# Altium footprint library PcbLib_ICs.PcbLib: 317 footprints (part 8 of 24)
Each footprint in its own frame and in the unit in brackets; x right, y up, seen from the top. Pads: shape width x height; smd on the part's side, far side on the other; paste and mask are expansions set on the pad; w line width, h text height; cw(c..) or ccw(c..) is an arc to the next point about the centre after c.
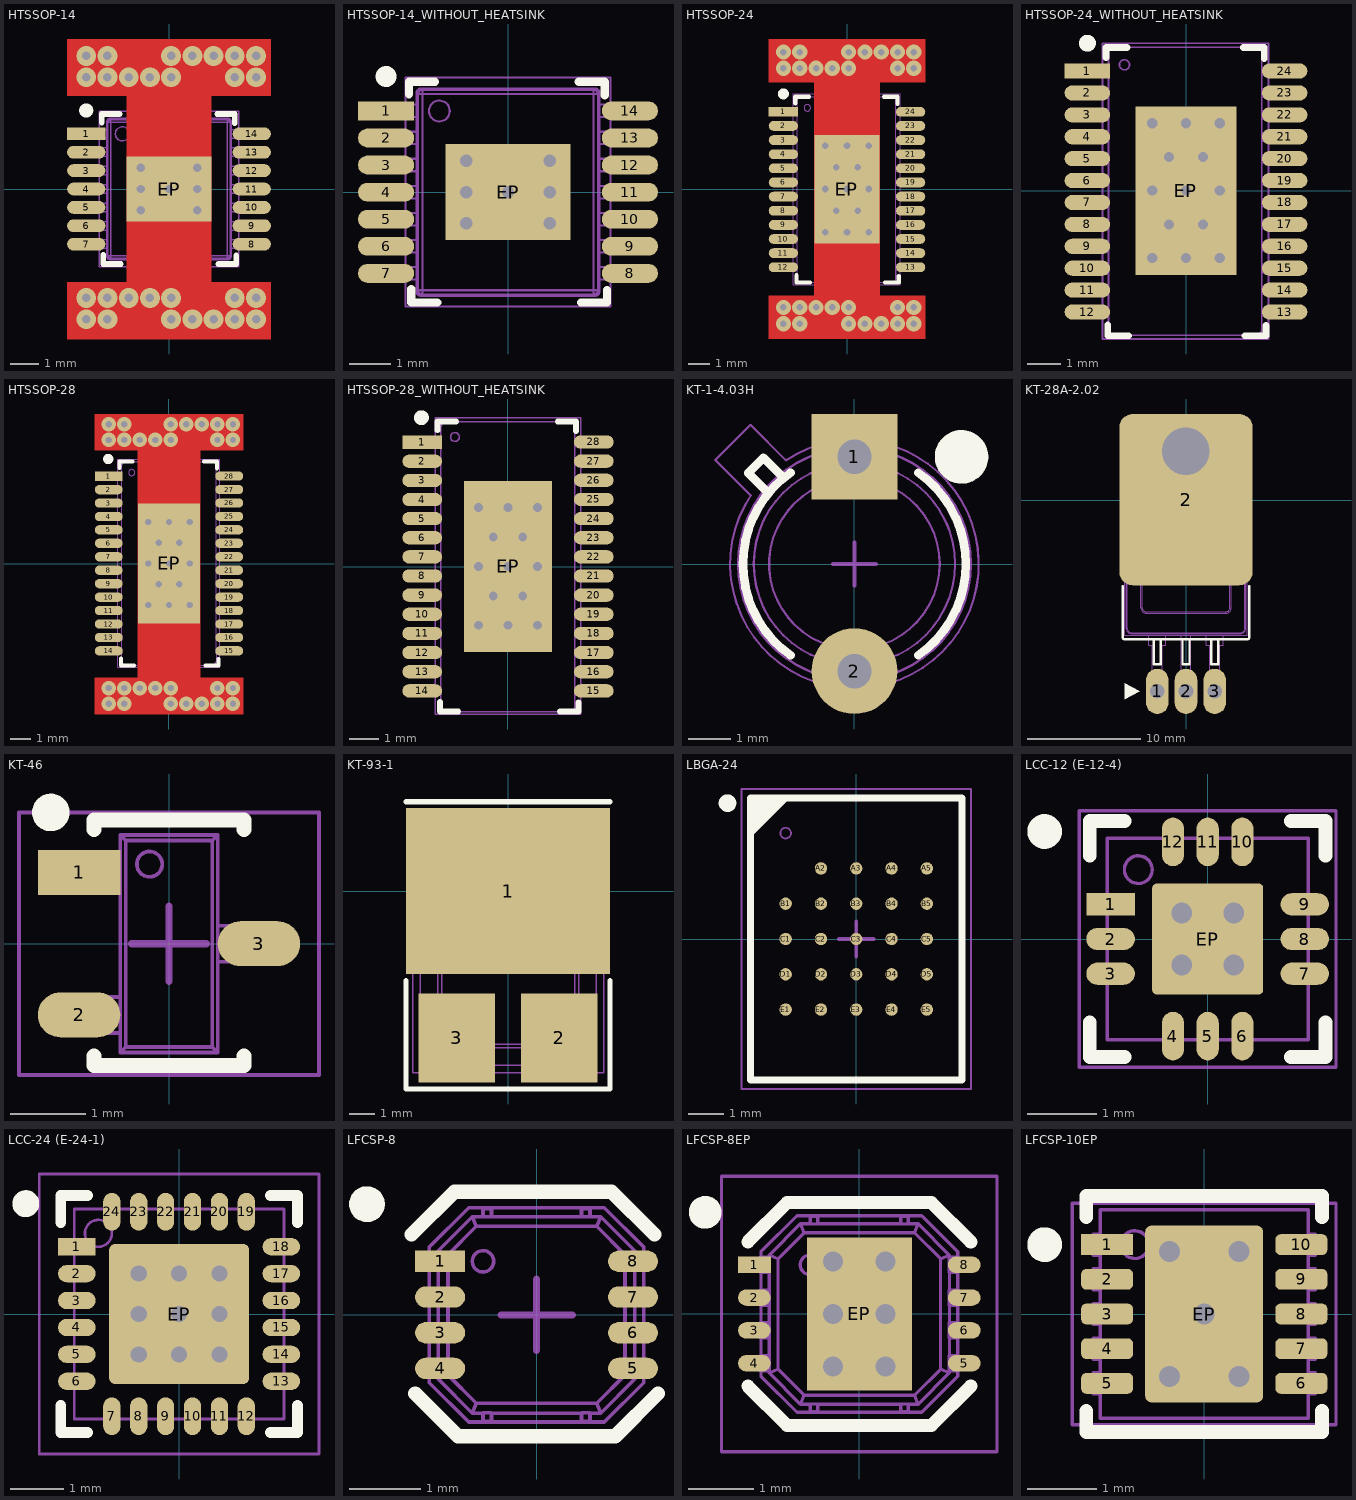
[diagram p7: the footprints below, top view; thin cyan lines are the x and y axes]

## HTSSOP-14 [mm]
pads (15):
  rect 1.35x0.45 smd paste+0 mask+0.05: 1(-2.925,1.95)
  oval 1.35x0.45 smd paste+0 mask+0.05: 2(-2.925,1.3) 3(-2.925,0.65) 4(-2.925,0) 5(-2.925,-0.65) 6(-2.925,-1.3) 7(-2.925,-1.95) 8(2.925,-1.95) 9(2.925,-1.3) 10(2.925,-0.65) 11(2.925,0) 12(2.925,0.65) 13(2.925,1.3) 14(2.925,1.95)
  rect 3x2.31 smd paste-10 mask+0.05: EP(0,0)
via 0,0 diameter 0.7 hole 0.3
via 1,0 diameter 0.7 hole 0.3
via -1,0 diameter 0.7 hole 0.3
via -1,0.75 diameter 0.7 hole 0.3
via 1,0.75 diameter 0.7 hole 0.3
via 1,-0.75 diameter 0.7 hole 0.3
via -1,-0.75 diameter 0.7 hole 0.3
via -2.925,4.7 diameter 0.7 hole 0.3
via -2.925,3.95 diameter 0.7 hole 0.3
via -2.175,4.7 diameter 0.7 hole 0.3
via -2.175,3.95 diameter 0.7 hole 0.3
via -1.425,3.95 diameter 0.7 hole 0.3
via -0.675,3.95 diameter 0.7 hole 0.3
via 0.075,4.7 diameter 0.7 hole 0.3
via 0.075,3.95 diameter 0.7 hole 0.3
via 0.825,4.7 diameter 0.7 hole 0.3
via 1.575,4.7 diameter 0.7 hole 0.3
via 2.325,3.95 diameter 0.7 hole 0.3
via 2.325,4.7 diameter 0.7 hole 0.3
via 3.075,4.7 diameter 0.7 hole 0.3
via 3.075,3.95 diameter 0.7 hole 0.3
via 3.075,-3.85 diameter 0.7 hole 0.3
via 3.075,-4.6 diameter 0.7 hole 0.3
via 2.325,-3.85 diameter 0.7 hole 0.3
via 2.325,-4.6 diameter 0.7 hole 0.3
via 1.575,-4.6 diameter 0.7 hole 0.3
via 0.825,-4.6 diameter 0.7 hole 0.3
via 0.075,-4.6 diameter 0.7 hole 0.3
via 0.075,-3.85 diameter 0.7 hole 0.3
via -0.675,-3.85 diameter 0.7 hole 0.3
via -1.425,-3.85 diameter 0.7 hole 0.3
via -2.175,-3.85 diameter 0.7 hole 0.3
via -2.175,-4.6 diameter 0.7 hole 0.3
via -2.925,-4.6 diameter 0.7 hole 0.3
via -2.925,-3.85 diameter 0.7 hole 0.3
Top Layer:
  region: -1.5,3.3 -3.6,3.3 -3.6,5.3 3.6,5.3 3.6,3.3 1.5,3.3 1.5,-3.3 3.6,-3.3 3.6,-5.3 -3.6,-5.3 -3.6,-3.3 -1.5,-3.3
Top Overlay:
  circle w0.25: c-2.925,2.775 r0.125
  lines w0.2: -2.375,2.35 -2.375,2.65 -1.75,2.65 ; -2.325,-2.325 -2.325,-2.65 -1.7,-2.65 ; 1.7,2.65 2.325,2.65 2.325,2.325 ; 1.75,-2.65 2.375,-2.65 2.375,-2.35
Top Paste:
  rectangle: 0.1,-0.3 0.7,0.3
  region: -0.1,0.3 -0.7,0.3 -0.7,-0.3 -0.1,-0.3
  region: -0.9,0.3 -1.5,0.3 -1.5,-0.3 -0.9,-0.3
  region: 1.5,0.3 0.9,0.3 0.9,-0.3 1.5,-0.3
  rectangle: 0.1,0.5 0.7,1.1
  region: -0.1,1.1 -0.7,1.1 -0.7,0.5 -0.1,0.5
  region: -0.9,1.1 -1.5,1.1 -1.5,0.5 -0.9,0.5
  region: 1.5,1.1 0.9,1.1 0.9,0.5 1.5,0.5
  rectangle: 0.1,-1.1 0.7,-0.5
  region: -0.1,-0.5 -0.7,-0.5 -0.7,-1.1 -0.1,-1.1
  region: -0.9,-0.5 -1.5,-0.5 -1.5,-1.1 -0.9,-1.1
  region: 1.5,-0.5 0.9,-0.5 0.9,-1.1 1.5,-1.1
Top Solder:
  region: -1.55,3.3 -3.6,3.3 -3.6,5.3 3.6,5.3 3.6,3.3 1.55,3.3 1.55,-3.3 3.6,-3.3 3.6,-5.3 -3.6,-5.3 -3.6,-3.3 -1.55,-3.3
Bottom Solder:
  region: -1.5,-1.5 -1.5,1.5 -0.5,1.5 0,1 0.5,1.5 1.5,1.5 1.5,-1.5 0.5,-1.5 0,-1 -0.5,-1.5
Top Assy:
  drawing of 275 lines, arcs and shapes, not listed
  text ".Designator" at -3.443,-0.467 h2
Top Text:
  lines w0.05: -2.464,-2.75 2.464,-2.75 2.464,2.75 -2.464,2.75 -2.464,-2.75
  lines w0.1: -0.5,0 0.5,0 ; 0,-0.5 0,0.5
3D body "HTSSOP14.x_t": height 1.1, standoff 0, extent -3.191,-2.491 3.191,2.491

## HTSSOP-14_WITHOUT_HEATSINK [mm]
pads (15):
  rect 1.35x0.45 smd paste+0 mask+0.05: 1(-2.925,1.95)
  oval 1.35x0.45 smd paste+0 mask+0.05: 2(-2.925,1.3) 3(-2.925,0.65) 4(-2.925,0) 5(-2.925,-0.65) 6(-2.925,-1.3) 7(-2.925,-1.95) 8(2.925,-1.95) 9(2.925,-1.3) 10(2.925,-0.65) 11(2.925,0) 12(2.925,0.65) 13(2.925,1.3) 14(2.925,1.95)
  rect 3x2.31 smd paste-10 mask+0.05: EP(0,0)
via -1,-0.75 diameter 0.7 hole 0.3
via 1,-0.75 diameter 0.7 hole 0.3
via 1,0.75 diameter 0.7 hole 0.3
via -1,0.75 diameter 0.7 hole 0.3
via -1,0 diameter 0.7 hole 0.3
via 1,0 diameter 0.7 hole 0.3
via 0,0 diameter 0.7 hole 0.3
Top Overlay:
  circle w0.25: c-2.925,2.775 r0.125
  lines w0.2: -2.375,2.35 -2.375,2.65 -1.75,2.65 ; -2.325,-2.325 -2.325,-2.65 -1.7,-2.65 ; 1.7,2.65 2.325,2.65 2.325,2.325 ; 1.75,-2.65 2.375,-2.65 2.375,-2.35
Top Paste:
  region: 1.5,-0.5 0.9,-0.5 0.9,-1.1 1.5,-1.1
  region: -0.9,-0.5 -1.5,-0.5 -1.5,-1.1 -0.9,-1.1
  region: -0.1,-0.5 -0.7,-0.5 -0.7,-1.1 -0.1,-1.1
  rectangle: 0.1,-1.1 0.7,-0.5
  region: 1.5,1.1 0.9,1.1 0.9,0.5 1.5,0.5
  region: -0.9,1.1 -1.5,1.1 -1.5,0.5 -0.9,0.5
  region: -0.1,1.1 -0.7,1.1 -0.7,0.5 -0.1,0.5
  rectangle: 0.1,0.5 0.7,1.1
  region: 1.5,0.3 0.9,0.3 0.9,-0.3 1.5,-0.3
  region: -0.9,0.3 -1.5,0.3 -1.5,-0.3 -0.9,-0.3
  region: -0.1,0.3 -0.7,0.3 -0.7,-0.3 -0.1,-0.3
  rectangle: 0.1,-0.3 0.7,0.3
Bottom Solder:
  region: -1.5,-1.5 -1.5,1.5 -0.5,1.5 0,1 0.5,1.5 1.5,1.5 1.5,-1.5 0.5,-1.5 0,-1 -0.5,-1.5
Top Assy:
  drawing of 275 lines, arcs and shapes, not listed
  text ".Designator" at -3.443,-0.467 h2
Top Text:
  lines w0.05: -2.464,-2.75 2.464,-2.75 2.464,2.75 -2.464,2.75 -2.464,-2.75
  lines w0.1: -0.5,0 0.5,0 ; 0,-0.5 0,0.5
3D body "HTSSOP14.x_t": height 1.1, standoff 0, extent -3.191,-2.491 3.191,2.491

## HTSSOP-24 [mm]
pads (25):
  rect 1.35x0.45 smd paste+0 mask+0.05: 1(-2.925,3.55)
  oval 1.35x0.45 smd paste+0 mask+0.05: 2(-2.925,2.9) 3(-2.925,2.25) 4(-2.925,1.6) 5(-2.925,0.95) 6(-2.925,0.3) 7(-2.925,-0.35) 8(-2.925,-1) 9(-2.925,-1.65) 10(-2.925,-2.3) 11(-2.925,-2.95) 12(-2.925,-3.6) 13(2.925,-3.6) 14(2.925,-2.95) 15(2.925,-2.3) 16(2.925,-1.65) 17(2.925,-1) 18(2.925,-0.35) 19(2.925,0.3) 20(2.925,0.95) 21(2.925,1.6) 22(2.925,2.25) 23(2.925,2.9) 24(2.925,3.55)
  rect 3x5 smd paste-10 mask+0.05: EP(-0.004,-0.006)
via -1,2 diameter 0.7 hole 0.3
via 1,2 diameter 0.7 hole 0.3
via 0,2 diameter 0.7 hole 0.3
via -0.5,1 diameter 0.7 hole 0.3
via 0.5,1 diameter 0.7 hole 0.3
via 0,0 diameter 0.7 hole 0.3
via 1,0 diameter 0.7 hole 0.3
via -1,0 diameter 0.7 hole 0.3
via -1,-2 diameter 0.7 hole 0.3
via 1,-2 diameter 0.7 hole 0.3
via 0,-2 diameter 0.7 hole 0.3
via 0.5,-1 diameter 0.7 hole 0.3
via -0.5,-1 diameter 0.7 hole 0.3
via -2.925,6.3 diameter 0.7 hole 0.3
via -2.925,5.55 diameter 0.7 hole 0.3
via -2.175,6.3 diameter 0.7 hole 0.3
via -2.175,5.55 diameter 0.7 hole 0.3
via -1.425,5.55 diameter 0.7 hole 0.3
via -0.675,5.55 diameter 0.7 hole 0.3
via 0.075,6.3 diameter 0.7 hole 0.3
via 0.075,5.55 diameter 0.7 hole 0.3
via 0.825,6.3 diameter 0.7 hole 0.3
via 1.575,6.3 diameter 0.7 hole 0.3
via 2.325,5.55 diameter 0.7 hole 0.3
via 2.325,6.3 diameter 0.7 hole 0.3
via 3.075,6.3 diameter 0.7 hole 0.3
via 3.075,5.55 diameter 0.7 hole 0.3
via 3.075,-5.45 diameter 0.7 hole 0.3
via 3.075,-6.2 diameter 0.7 hole 0.3
via 2.325,-5.45 diameter 0.7 hole 0.3
via 2.325,-6.2 diameter 0.7 hole 0.3
via 1.575,-6.2 diameter 0.7 hole 0.3
via 0.825,-6.2 diameter 0.7 hole 0.3
via 0.075,-6.2 diameter 0.7 hole 0.3
via 0.075,-5.45 diameter 0.7 hole 0.3
via -0.675,-5.45 diameter 0.7 hole 0.3
via -1.425,-5.45 diameter 0.7 hole 0.3
via -2.175,-5.45 diameter 0.7 hole 0.3
via -2.175,-6.2 diameter 0.7 hole 0.3
via -2.925,-6.2 diameter 0.7 hole 0.3
via -2.925,-5.45 diameter 0.7 hole 0.3
Top Layer:
  region: -1.5,4.9 -3.6,4.9 -3.6,6.9 3.6,6.9 3.6,4.9 1.5,4.9 1.5,-4.9 3.6,-4.9 3.6,-6.9 -3.6,-6.9 -3.6,-4.9 -1.5,-4.9
Top Overlay:
  circle w0.25: c-2.925,4.375 r0.125
  lines w0.2: -2.375,3.95 -2.375,4.25 -1.75,4.25 ; -2.325,-3.975 -2.325,-4.3 -1.7,-4.3 ; 1.7,4.25 2.325,4.25 2.325,3.925 ; 1.75,-4.3 2.375,-4.3 2.375,-4
Top Paste:
  rectangle: 0.1,-0.3 0.7,0.3
  region: -0.1,0.3 -0.7,0.3 -0.7,-0.3 -0.1,-0.3
  region: -0.9,0.3 -1.5,0.3 -1.5,-0.3 -0.9,-0.3
  region: 1.5,0.3 0.9,0.3 0.9,-0.3 1.5,-0.3
  rectangle: 0.1,0.5 0.7,1.1
  region: -0.1,1.1 -0.7,1.1 -0.7,0.5 -0.1,0.5
  region: -0.9,1.1 -1.5,1.1 -1.5,0.5 -0.9,0.5
  region: 1.5,1.1 0.9,1.1 0.9,0.5 1.5,0.5
  rectangle: 0.1,-1.1 0.7,-0.5
  region: -0.1,-0.5 -0.7,-0.5 -0.7,-1.1 -0.1,-1.1
  region: -0.9,-0.5 -1.5,-0.5 -1.5,-1.1 -0.9,-1.1
  region: 1.5,-0.5 0.9,-0.5 0.9,-1.1 1.5,-1.1
  rectangle: 0.1,-1.9 0.7,-1.3
  region: -0.1,-1.3 -0.7,-1.3 -0.7,-1.9 -0.1,-1.9
  region: -0.9,-1.3 -1.5,-1.3 -1.5,-1.9 -0.9,-1.9
  region: 1.5,-1.3 0.9,-1.3 0.9,-1.9 1.5,-1.9
  rectangle: 0.1,-2.7 0.7,-2.1
  region: -0.1,-2.1 -0.7,-2.1 -0.7,-2.7 -0.1,-2.7
  region: -0.9,-2.1 -1.5,-2.1 -1.5,-2.7 -0.9,-2.7
  region: 1.5,-2.1 0.9,-2.1 0.9,-2.7 1.5,-2.7
  region: -0.1,1.9 -0.7,1.9 -0.7,1.3 -0.1,1.3
  rectangle: 0.1,1.3 0.7,1.9
  rectangle: 0.9,1.3 1.5,1.9
  rectangle: -1.5,1.3 -0.9,1.9
  region: -0.1,2.7 -0.7,2.7 -0.7,2.1 -0.1,2.1
  rectangle: 0.1,2.1 0.7,2.7
  rectangle: 0.9,2.1 1.5,2.7
  rectangle: -1.5,2.1 -0.9,2.7
Top Solder:
  region: -3.6,6.9 3.6,6.9 3.6,4.9 1.5,4.9 1.5,2.5 -1.5,2.5 -1.5,4.9 -3.6,4.9
  region: 3.6,-6.9 -3.6,-6.9 -3.6,-4.9 -1.5,-4.9 -1.5,-2.5 1.5,-2.5 1.5,-4.9 3.6,-4.9
  region: -1.5,4.9 -3.6,4.9 -3.6,6.9 3.6,6.9 3.6,4.9 1.5,4.9 1.5,-4.9 3.6,-4.9 3.6,-6.9 -3.6,-6.9 -3.6,-4.9 -1.5,-4.9
Bottom Solder:
  region: -1.5,2.5 1.5,2.5 1.5,1.5 1.25,1 1.5,0.5 1.5,-0.5 1.25,-1 1.5,-1.5 1.5,-2.5 -1.5,-2.5 -1.5,-1.5 -1.25,-1 -1.5,-0.5 -1.5,0.5 -1.25,1 -1.5,1.5
  region: -1.5,4.9 -3.6,4.9 -3.6,6.9 3.6,6.9 3.6,4.9 1.5,4.9 1.5,-4.9 3.6,-4.9 3.6,-6.9 -3.6,-6.9 -3.6,-4.9 -1.5,-4.9
Top Assy:
  drawing of 408 lines, arcs and shapes, not listed
  text ".Designator" at -3.443,-0.467 h2
Top Text:
  lines w0.05: -2.478,-4.4 2.45,-4.4 2.45,4.375 -2.478,4.375 -2.478,-4.4
  lines w0.1: -0.5,0 0.5,0 ; 0,-0.5 0,0.5
3D body "MO-153AD.stp": height 1.2, standoff 0, extent -3.314,-3.979 3.286,3.921

## HTSSOP-24_WITHOUT_HEATSINK [mm]
pads (25):
  rect 1.35x0.45 smd paste+0 mask+0.05: 1(-2.925,3.55)
  oval 1.35x0.45 smd paste+0 mask+0.05: 2(-2.925,2.9) 3(-2.925,2.25) 4(-2.925,1.6) 5(-2.925,0.95) 6(-2.925,0.3) 7(-2.925,-0.35) 8(-2.925,-1) 9(-2.925,-1.65) 10(-2.925,-2.3) 11(-2.925,-2.95) 12(-2.925,-3.6) 13(2.925,-3.6) 14(2.925,-2.95) 15(2.925,-2.3) 16(2.925,-1.65) 17(2.925,-1) 18(2.925,-0.35) 19(2.925,0.3) 20(2.925,0.95) 21(2.925,1.6) 22(2.925,2.25) 23(2.925,2.9) 24(2.925,3.55)
  rect 3x5 smd paste-10 mask+0.05: EP(-0.004,-0.006)
via -0.5,-1 diameter 0.7 hole 0.3
via 0.5,-1 diameter 0.7 hole 0.3
via 0,-2 diameter 0.7 hole 0.3
via 1,-2 diameter 0.7 hole 0.3
via -1,-2 diameter 0.7 hole 0.3
via -1,0 diameter 0.7 hole 0.3
via 1,0 diameter 0.7 hole 0.3
via 0,0 diameter 0.7 hole 0.3
via 0.5,1 diameter 0.7 hole 0.3
via -0.5,1 diameter 0.7 hole 0.3
via 0,2 diameter 0.7 hole 0.3
via 1,2 diameter 0.7 hole 0.3
via -1,2 diameter 0.7 hole 0.3
Top Overlay:
  circle w0.25: c-2.925,4.375 r0.125
  lines w0.2: -2.375,3.95 -2.375,4.25 -1.75,4.25 ; -2.325,-3.975 -2.325,-4.3 -1.7,-4.3 ; 1.7,4.25 2.325,4.25 2.325,3.925 ; 1.75,-4.3 2.375,-4.3 2.375,-4
Top Paste:
  rectangle: -1.5,2.1 -0.9,2.7
  rectangle: 0.9,2.1 1.5,2.7
  rectangle: 0.1,2.1 0.7,2.7
  region: -0.1,2.7 -0.7,2.7 -0.7,2.1 -0.1,2.1
  rectangle: -1.5,1.3 -0.9,1.9
  rectangle: 0.9,1.3 1.5,1.9
  rectangle: 0.1,1.3 0.7,1.9
  region: -0.1,1.9 -0.7,1.9 -0.7,1.3 -0.1,1.3
  region: 1.5,-2.1 0.9,-2.1 0.9,-2.7 1.5,-2.7
  region: -0.9,-2.1 -1.5,-2.1 -1.5,-2.7 -0.9,-2.7
  region: -0.1,-2.1 -0.7,-2.1 -0.7,-2.7 -0.1,-2.7
  rectangle: 0.1,-2.7 0.7,-2.1
  region: 1.5,-1.3 0.9,-1.3 0.9,-1.9 1.5,-1.9
  region: -0.9,-1.3 -1.5,-1.3 -1.5,-1.9 -0.9,-1.9
  region: -0.1,-1.3 -0.7,-1.3 -0.7,-1.9 -0.1,-1.9
  rectangle: 0.1,-1.9 0.7,-1.3
  region: 1.5,-0.5 0.9,-0.5 0.9,-1.1 1.5,-1.1
  region: -0.9,-0.5 -1.5,-0.5 -1.5,-1.1 -0.9,-1.1
  region: -0.1,-0.5 -0.7,-0.5 -0.7,-1.1 -0.1,-1.1
  rectangle: 0.1,-1.1 0.7,-0.5
  region: 1.5,1.1 0.9,1.1 0.9,0.5 1.5,0.5
  region: -0.9,1.1 -1.5,1.1 -1.5,0.5 -0.9,0.5
  region: -0.1,1.1 -0.7,1.1 -0.7,0.5 -0.1,0.5
  rectangle: 0.1,0.5 0.7,1.1
  region: 1.5,0.3 0.9,0.3 0.9,-0.3 1.5,-0.3
  region: -0.9,0.3 -1.5,0.3 -1.5,-0.3 -0.9,-0.3
  region: -0.1,0.3 -0.7,0.3 -0.7,-0.3 -0.1,-0.3
  rectangle: 0.1,-0.3 0.7,0.3
Bottom Solder:
  region: -1.5,2.5 1.5,2.5 1.5,1.5 1.25,1 1.5,0.5 1.5,-0.5 1.25,-1 1.5,-1.5 1.5,-2.5 -1.5,-2.5 -1.5,-1.5 -1.25,-1 -1.5,-0.5 -1.5,0.5 -1.25,1 -1.5,1.5
Top Assy:
  drawing of 408 lines, arcs and shapes, not listed
  text ".Designator" at -3.443,-0.467 h2
Top Text:
  lines w0.05: -2.478,-4.4 -2.478,4.375 2.45,4.375 2.45,-4.4 -2.478,-4.4
  lines w0.1: -0.5,0 0.5,0 ; 0,-0.5 0,0.5
3D body "MO-153AD.stp": height 1.2, standoff 0, extent -3.314,-3.979 3.286,3.921

## HTSSOP-28 [mm]
height 1.1
pads (29):
  rect 1.35x0.45 smd paste+0 mask+0.05: 1(-2.911,4.226)
  oval 1.35x0.45 smd paste+0 mask+0.05: 2(-2.911,3.576) 3(-2.911,2.926) 4(-2.911,2.276) 5(-2.911,1.632) 6(-2.911,0.982) 7(-2.911,0.332) 8(-2.911,-0.318) 9(-2.911,-0.968) 10(-2.911,-1.618) 11(-2.911,-2.268) 12(-2.911,-2.918) 13(-2.911,-3.568) 14(-2.911,-4.218) 15(2.914,-4.218) 16(2.914,-3.568) 17(2.914,-2.918) 18(2.914,-2.268) 19(2.914,-1.618) 20(2.914,-0.968) 21(2.914,-0.318) 22(2.914,0.332) 23(2.914,0.982) 24(2.914,1.632) 25(2.914,2.282) 26(2.914,2.932) 27(2.914,3.582) 28(2.914,4.232)
  rect 3x5.8 smd paste-10 mask+0.05: EP(0.002,0.007)
via -0.998,2.007 diameter 0.7 hole 0.3
via 1.002,2.007 diameter 0.7 hole 0.3
via 0.002,2.007 diameter 0.7 hole 0.3
via -0.498,1.007 diameter 0.7 hole 0.3
via 0.502,1.007 diameter 0.7 hole 0.3
via 0.002,0.007 diameter 0.7 hole 0.3
via 1.002,0.007 diameter 0.7 hole 0.3
via -0.998,0.007 diameter 0.7 hole 0.3
via -0.998,-1.993 diameter 0.7 hole 0.3
via 1.002,-1.993 diameter 0.7 hole 0.3
via 0.002,-1.993 diameter 0.7 hole 0.3
via 0.502,-0.993 diameter 0.7 hole 0.3
via -0.498,-0.993 diameter 0.7 hole 0.3
via -2.911,6.732 diameter 0.7 hole 0.3
via -2.911,5.982 diameter 0.7 hole 0.3
via -2.161,6.732 diameter 0.7 hole 0.3
via -2.161,5.982 diameter 0.7 hole 0.3
via -1.411,5.982 diameter 0.7 hole 0.3
via -0.661,5.982 diameter 0.7 hole 0.3
via 0.089,6.732 diameter 0.7 hole 0.3
via 0.089,5.982 diameter 0.7 hole 0.3
via 0.839,6.732 diameter 0.7 hole 0.3
via 1.589,6.732 diameter 0.7 hole 0.3
via 2.339,5.982 diameter 0.7 hole 0.3
via 2.339,6.732 diameter 0.7 hole 0.3
via 3.089,6.732 diameter 0.7 hole 0.3
via 3.089,5.982 diameter 0.7 hole 0.3
via 3.089,-6.018 diameter 0.7 hole 0.3
via 3.089,-6.768 diameter 0.7 hole 0.3
via 2.339,-6.018 diameter 0.7 hole 0.3
via 2.339,-6.768 diameter 0.7 hole 0.3
via 1.589,-6.768 diameter 0.7 hole 0.3
via 0.839,-6.768 diameter 0.7 hole 0.3
via 0.089,-6.768 diameter 0.7 hole 0.3
via 0.089,-6.018 diameter 0.7 hole 0.3
via -0.661,-6.018 diameter 0.7 hole 0.3
via -1.411,-6.018 diameter 0.7 hole 0.3
via -2.161,-6.018 diameter 0.7 hole 0.3
via -2.161,-6.768 diameter 0.7 hole 0.3
via -2.911,-6.768 diameter 0.7 hole 0.3
via -2.911,-6.018 diameter 0.7 hole 0.3
Top Layer:
  region: -1.498,5.482 -3.598,5.482 -3.598,7.232 3.602,7.232 3.602,5.482 1.502,5.482 1.502,-5.518 3.602,-5.518 3.602,-7.268 -3.598,-7.268 -3.598,-5.518 -1.498,-5.518
Top Overlay:
  circle w0.25: c-2.936,5.057 r0.125
  lines w0.2: -2.386,4.632 -2.386,4.932 -1.761,4.932 ; -2.311,-4.593 -2.311,-4.918 -1.686,-4.918 ; 1.689,4.932 2.314,4.932 2.314,4.607 ; 1.764,-4.918 2.389,-4.918 2.389,-4.618
Top Paste:
  rectangle: -1.498,-2.693 -0.898,-2.093
  rectangle: 0.902,-2.693 1.502,-2.093
  rectangle: 0.102,-2.693 0.702,-2.093
  region: -0.098,-2.093 -0.698,-2.093 -0.698,-2.693 -0.098,-2.693
  rectangle: -1.498,-1.893 -0.898,-1.293
  rectangle: 0.902,-1.893 1.502,-1.293
  rectangle: 0.102,-1.893 0.702,-1.293
  region: -0.098,-1.293 -0.698,-1.293 -0.698,-1.893 -0.098,-1.893
  region: 1.502,2.707 0.902,2.707 0.902,2.107 1.502,2.107
  region: -0.898,2.707 -1.498,2.707 -1.498,2.107 -0.898,2.107
  region: -0.098,2.707 -0.698,2.707 -0.698,2.107 -0.098,2.107
  rectangle: 0.102,2.107 0.702,2.707
  region: 1.502,1.907 0.902,1.907 0.902,1.307 1.502,1.307
  region: -0.898,1.907 -1.498,1.907 -1.498,1.307 -0.898,1.307
  region: -0.098,1.907 -0.698,1.907 -0.698,1.307 -0.098,1.307
  rectangle: 0.102,1.307 0.702,1.907
  region: 1.502,-0.493 0.902,-0.493 0.902,-1.093 1.502,-1.093
  region: -0.898,-0.493 -1.498,-0.493 -1.498,-1.093 -0.898,-1.093
  region: -0.098,-0.493 -0.698,-0.493 -0.698,-1.093 -0.098,-1.093
  rectangle: 0.102,-1.093 0.702,-0.493
  region: 1.502,1.107 0.902,1.107 0.902,0.507 1.502,0.507
  region: -0.898,1.107 -1.498,1.107 -1.498,0.507 -0.898,0.507
  region: -0.098,1.107 -0.698,1.107 -0.698,0.507 -0.098,0.507
  rectangle: 0.102,0.507 0.702,1.107
  region: 1.502,0.307 0.902,0.307 0.902,-0.293 1.502,-0.293
  region: -0.898,0.307 -1.498,0.307 -1.498,-0.293 -0.898,-0.293
  region: -0.098,0.307 -0.698,0.307 -0.698,-0.293 -0.098,-0.293
  rectangle: 0.102,-0.293 0.702,0.307
Top Solder:
  region: -1.498,5.482 -3.598,5.482 -3.598,7.232 3.602,7.232 3.602,5.482 1.502,5.482 1.502,-5.518 3.602,-5.518 3.602,-7.268 -3.598,-7.268 -3.598,-5.518 -1.498,-5.518
  region: -1.498,5.482 -3.598,5.482 -3.598,7.232 3.602,7.232 3.602,5.482 1.502,5.482 1.502,-5.518 3.602,-5.518 3.602,-7.268 -3.598,-7.268 -3.598,-5.518 -1.498,-5.518
Bottom Solder:
  region: -1.498,5.482 -3.598,5.482 -3.598,7.232 3.602,7.232 3.602,5.482 1.502,5.482 1.502,-5.518 3.602,-5.518 3.602,-7.268 -3.598,-7.268 -3.598,-5.518 -1.498,-5.518
Top Assy:
  drawing of 472 lines, arcs and shapes, not listed
  text ".Designator" at -3.442,-0.46 h2
Top Text:
  lines w0.05: -2.464,-5.004 2.464,-5.004 2.464,5.051 -2.464,5.051 -2.464,-5.004
  lines w0.1: -0.5,0 0.5,0 ; 0,-0.5 0,0.5
3D body "MO-153AE.stp": height 1.2, standoff 0, extent -3.3,-4.9 3.3,4.9

## HTSSOP-28_WITHOUT_HEATSINK [mm]
height 1.1
pads (29):
  rect 1.35x0.45 smd paste+0 mask+0.05: 1(-2.911,4.226)
  oval 1.35x0.45 smd paste+0 mask+0.05: 2(-2.911,3.576) 3(-2.911,2.926) 4(-2.911,2.276) 5(-2.911,1.632) 6(-2.911,0.982) 7(-2.911,0.332) 8(-2.911,-0.318) 9(-2.911,-0.968) 10(-2.911,-1.618) 11(-2.911,-2.268) 12(-2.911,-2.918) 13(-2.911,-3.568) 14(-2.911,-4.218) 15(2.914,-4.218) 16(2.914,-3.568) 17(2.914,-2.918) 18(2.914,-2.268) 19(2.914,-1.618) 20(2.914,-0.968) 21(2.914,-0.318) 22(2.914,0.332) 23(2.914,0.982) 24(2.914,1.632) 25(2.914,2.282) 26(2.914,2.932) 27(2.914,3.582) 28(2.914,4.232)
  rect 3x5.8 smd paste-10 mask+0.05: EP(0.002,0.007)
via -0.998,2.007 diameter 0.7 hole 0.3
via 1.002,2.007 diameter 0.7 hole 0.3
via 0.002,2.007 diameter 0.7 hole 0.3
via -0.498,1.007 diameter 0.7 hole 0.3
via 0.502,1.007 diameter 0.7 hole 0.3
via 0.002,0.007 diameter 0.7 hole 0.3
via 1.002,0.007 diameter 0.7 hole 0.3
via -0.998,0.007 diameter 0.7 hole 0.3
via -0.998,-1.993 diameter 0.7 hole 0.3
via 1.002,-1.993 diameter 0.7 hole 0.3
via 0.002,-1.993 diameter 0.7 hole 0.3
via 0.502,-0.993 diameter 0.7 hole 0.3
via -0.498,-0.993 diameter 0.7 hole 0.3
Top Overlay:
  circle w0.25: c-2.936,5.057 r0.125
  lines w0.2: -2.386,4.632 -2.386,4.932 -1.761,4.932 ; -2.311,-4.593 -2.311,-4.918 -1.686,-4.918 ; 1.689,4.932 2.314,4.932 2.314,4.607 ; 1.764,-4.918 2.389,-4.918 2.389,-4.618
Top Paste:
  rectangle: -1.498,-2.693 -0.898,-2.093
  rectangle: 0.902,-2.693 1.502,-2.093
  rectangle: 0.102,-2.693 0.702,-2.093
  region: -0.098,-2.093 -0.698,-2.093 -0.698,-2.693 -0.098,-2.693
  rectangle: -1.498,-1.893 -0.898,-1.293
  rectangle: 0.902,-1.893 1.502,-1.293
  rectangle: 0.102,-1.893 0.702,-1.293
  region: -0.098,-1.293 -0.698,-1.293 -0.698,-1.893 -0.098,-1.893
  region: 1.502,2.707 0.902,2.707 0.902,2.107 1.502,2.107
  region: -0.898,2.707 -1.498,2.707 -1.498,2.107 -0.898,2.107
  region: -0.098,2.707 -0.698,2.707 -0.698,2.107 -0.098,2.107
  rectangle: 0.102,2.107 0.702,2.707
  region: 1.502,1.907 0.902,1.907 0.902,1.307 1.502,1.307
  region: -0.898,1.907 -1.498,1.907 -1.498,1.307 -0.898,1.307
  region: -0.098,1.907 -0.698,1.907 -0.698,1.307 -0.098,1.307
  rectangle: 0.102,1.307 0.702,1.907
  region: 1.502,-0.493 0.902,-0.493 0.902,-1.093 1.502,-1.093
  region: -0.898,-0.493 -1.498,-0.493 -1.498,-1.093 -0.898,-1.093
  region: -0.098,-0.493 -0.698,-0.493 -0.698,-1.093 -0.098,-1.093
  rectangle: 0.102,-1.093 0.702,-0.493
  region: 1.502,1.107 0.902,1.107 0.902,0.507 1.502,0.507
  region: -0.898,1.107 -1.498,1.107 -1.498,0.507 -0.898,0.507
  region: -0.098,1.107 -0.698,1.107 -0.698,0.507 -0.098,0.507
  rectangle: 0.102,0.507 0.702,1.107
  region: 1.502,0.307 0.902,0.307 0.902,-0.293 1.502,-0.293
  region: -0.898,0.307 -1.498,0.307 -1.498,-0.293 -0.898,-0.293
  region: -0.098,0.307 -0.698,0.307 -0.698,-0.293 -0.098,-0.293
  rectangle: 0.102,-0.293 0.702,0.307
Top Assy:
  drawing of 472 lines, arcs and shapes, not listed
  text ".Designator" at -3.442,-0.46 h2
Top Text:
  lines w0.05: -2.464,-5.004 2.464,-5.004 2.464,5.051 -2.464,5.051 -2.464,-5.004
  lines w0.1: -0.5,0 0.5,0 ; 0,-0.5 0,0.5
3D body "MO-153AE.stp": height 1.2, standoff 0, extent -3.3,-4.9 3.3,4.9

## KT-1-4.03H [mm]
height 4.57
pads (2):
  rect 2x2 hole 0.8: 1(0,2.5)
  round 2 hole 0.8: 2(0,-2.5)
Top Overlay:
  circle w0.65: c2.5,2.5 r0.3
  lines w0.2: -2.027,1.673 -2.477,2.123 -2.123,2.477 -1.673,2.027 ; -1.491,-2.13 cw(c0,0) -1.491,2.13 ; 1.491,-2.13 ccw(c0,0) 1.491,2.13
Top Assy:
  drawing of 609 lines, arcs and shapes, not listed
  text ".Designator" at -5.162,-0.7 h3
Top Text:
  lines w0.1: -0.5,0 0.5,0 ; 0,-0.5 0,0.5
3D body "��-1-4.03�.STEP": height 9.15, standoff -2.14, extent -3.247,-2.9 2.9,3.247
